# Altium footprint library WR-TBL_Rising Cage Clamp.PcbLib: 435 footprints (part 16 of 28)
Each footprint in its own frame and in the unit in brackets; x right, y up, seen from the top. Pads: shape width x height; smd on the part's side, far side on the other; paste and mask are expansions set on the pad; w line width, h text height; cw(c..) or ccw(c..) is an arc to the next point about the centre after c.
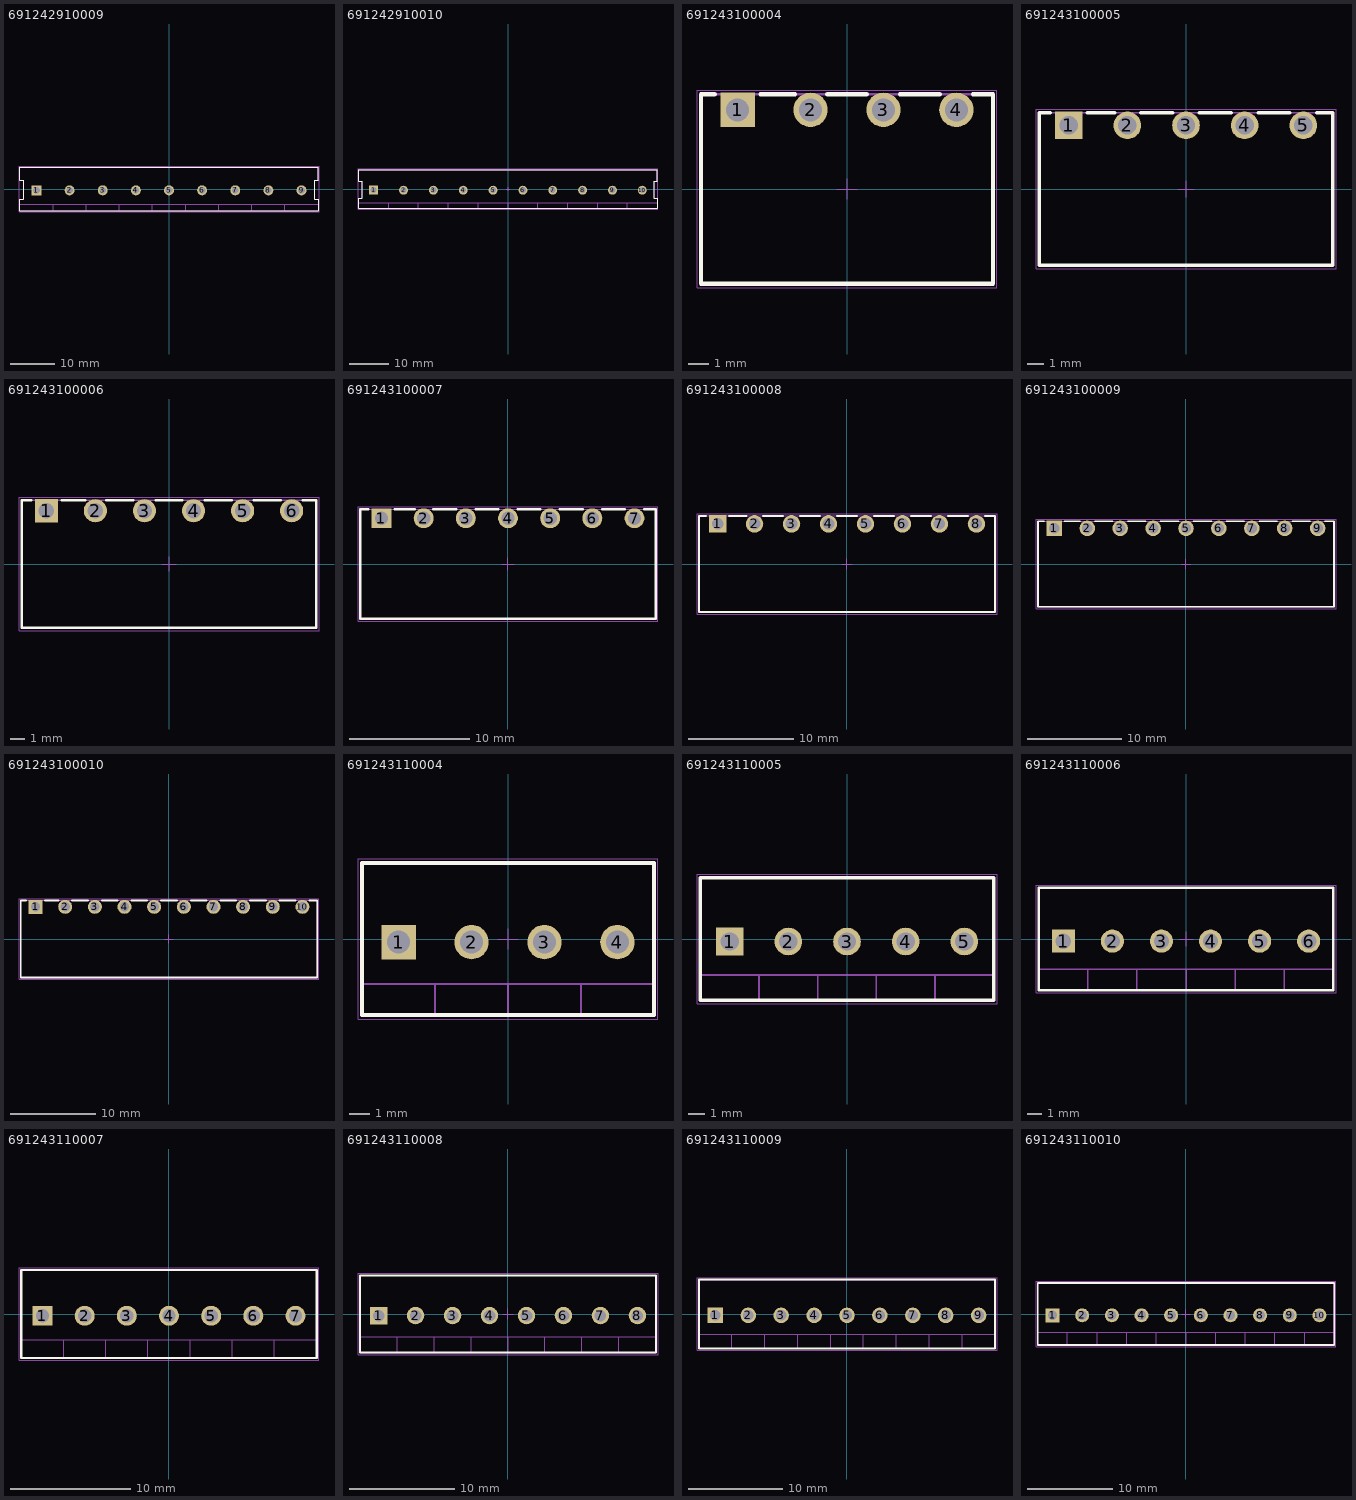
[diagram p15: the footprints below, top view; thin cyan lines are the x and y axes]

## 691242910009 [mm] "Serie 2429 -7.50 mm_9 pins"
height 13.8
pads (9):
  rect 2.25x2.25 hole 1.5: 1(-30,-0.3)
  round 2.25 hole 1.5: 2(-22.5,-0.3) 3(-15,-0.3) 4(-7.5,-0.3) 5(0,-0.3) 6(7.5,-0.3) 7(15,-0.3) 8(22.5,-0.3) 9(30,-0.3)
Top Overlay:
  lines w0.2: -33.75,-4.9 33.75,-4.9 33.75,-2.31 33,-2.31 33,1.94 33.75,1.94 33.75,4.9 -33.75,4.9 -33.75,1.94 -33,1.94 -33,-2.31 -33.75,-2.31 -33.75,-4.9
Mechanical 13:
  lines w0.1: -33.75,-3.4 33.75,-3.4 ; -26.25,-4.9 -26.25,-3.4 ; -18.75,-4.9 -18.75,-3.4 ; -11.25,-4.9 -11.25,-3.4 ; -3.75,-4.9 -3.75,-3.4 ; 3.75,-4.9 3.75,-3.4 ; 11.25,-4.9 11.25,-3.4 ; 18.75,-4.9 18.75,-3.4 ; 26.25,-4.9 26.25,-3.4 ; -33.75,-4.9 -33.75,-2.31 -33,-2.31 -33,1.94 -33.75,1.94 -33.75,4.9 33.75,4.9 33.75,1.94 33,1.94 33,-2.31 33.75,-2.31 33.75,-4.9 -33.75,-4.9
Mechanical 15:
  lines w0.05: -0.5,0 0.5,0 ; 0,-0.5 0,0.5 ; -33.95,-5.1 -33.95,5.1 33.95,5.1 33.95,-5.1 -33.95,-5.1
3D body "691242910009.stp": height 13.9, standoff -3.4, extent -33.75,-4.9 33.75,4.9

## 691242910010 [mm] "Serie 2429 -7.50 mm_10 pins"
height 13.8
pads (10):
  rect 2.25x2.25 hole 1.5: 1(-33.75,-0.3)
  round 2.25 hole 1.5: 2(-26.25,-0.3) 3(-18.75,-0.3) 4(-11.25,-0.3) 5(-3.75,-0.3) 6(3.75,-0.3) 7(11.25,-0.3) 8(18.75,-0.3) 9(26.25,-0.3) 10(33.75,-0.3)
Top Overlay:
  lines w0.2: -37.5,-4.9 37.5,-4.9 37.5,-2.31 36.75,-2.31 36.75,1.94 37.5,1.94 37.5,4.9 -37.5,4.9 -37.5,1.94 -36.75,1.94 -36.75,-2.31 -37.5,-2.31 -37.5,-4.9
Mechanical 13:
  lines w0.1: -37.5,-3.4 37.5,-3.4 ; -30,-4.9 -30,-3.4 ; -22.5,-4.9 -22.5,-3.4 ; -15,-4.9 -15,-3.4 ; -7.5,-4.9 -7.5,-3.4 ; 0,-4.9 0,-3.4 ; 7.5,-4.9 7.5,-3.4 ; 15,-4.9 15,-3.4 ; 22.5,-4.9 22.5,-3.4 ; 30,-4.9 30,-3.4 ; -37.5,-4.9 -37.5,-2.31 -36.75,-2.31 -36.75,1.94 -37.5,1.94 -37.5,4.9 37.5,4.9 37.5,1.94 36.75,1.94 36.75,-2.31 37.5,-2.31 37.5,-4.9 -37.5,-4.9
Mechanical 15:
  lines w0.05: -0.5,0 0.5,0 ; 0,-0.5 0,0.5 ; -37.7,-5.1 -37.7,5.1 37.7,5.1 37.7,-5.1 -37.7,-5.1
3D body "691242910010.stp": height 13.9, standoff -3.4, extent -37.5,-4.9 37.5,4.9

## 691243100004 [mm] "Serie 2431 - 3.50 mm _ 4 pins"
height 7.3
pads (4):
  rect 1.65x1.65 hole 1.1: 1(-5.25,3.8)
  round 1.65 hole 1.1: 2(-1.75,3.8) 3(1.75,3.8) 4(5.25,3.8)
Top Overlay:
  lines w0.2: -6.35,4.55 -7,4.55 -7,-4.55 7,-4.55 7,4.55 6.05,4.55 ; -4.15,4.55 -2.5,4.55 ; -0.95,4.55 0.95,4.55 ; 2.55,4.55 4.45,4.55
Mechanical 13:
  lines w0.1: -7,-4.55 7,-4.55 7,4.55 -7,4.55 -7,-4.55
Mechanical 15:
  lines w0.05: -0.5,0 0.5,0 ; 0,-0.5 0,0.5 ; -7.2,-4.75 7.2,-4.75 7.2,4.75 -7.2,4.75 -7.2,-4.75
3D body "691243100004.stp": height 7.35, standoff -3.45, extent -7,-4.55 7,4.55

## 691243100005 [mm] "Serie 2431 - 3.50 mm _ 5 pins"
height 7.3
pads (5):
  rect 1.65x1.65 hole 1.1: 1(-7,3.8)
  round 1.65 hole 1.1: 2(-3.5,3.8) 3(0,3.8) 4(3.5,3.8) 5(7,3.8)
Top Overlay:
  lines w0.2: -8.1,4.55 -8.75,4.55 -8.75,-4.55 8.75,-4.55 8.75,4.55 7.8,4.55 ; -5.9,4.55 -4.25,4.55 ; -2.7,4.55 -0.8,4.55 ; 0.8,4.55 2.7,4.55 ; 4.3,4.55 6.2,4.55
Mechanical 13:
  lines w0.1: -8.75,-4.55 -8.75,4.55 8.75,4.55 8.75,-4.55 -8.75,-4.55
Mechanical 15:
  lines w0.05: -0.5,0 0.5,0 ; 0,-0.5 0,0.5 ; -8.95,-4.75 -8.95,4.75 8.95,4.75 8.95,-4.75 -8.95,-4.75
3D body "691243100005.stp": height 7.35, standoff -3.45, extent -8.75,-4.55 8.75,4.55

## 691243100006 [mm] "Serie 2431 - 3.50 mm _ 6 pins"
height 7.3
pads (6):
  rect 1.65x1.65 hole 1.1: 1(-8.75,3.8)
  round 1.65 hole 1.1: 2(-5.25,3.8) 3(-1.75,3.8) 4(1.75,3.8) 5(5.25,3.8) 6(8.75,3.8)
Top Overlay:
  lines w0.2: -9.85,4.55 -10.5,4.55 -10.5,-4.55 10.5,-4.55 10.5,4.55 9.55,4.55 ; -7.65,4.55 -6,4.55 ; -4.45,4.55 -2.55,4.55 ; -0.95,4.55 0.95,4.55 ; 2.55,4.55 4.45,4.55 ; 6.05,4.55 7.95,4.55
Mechanical 13:
  lines w0.1: -10.5,-4.55 10.5,-4.55 10.5,4.55 -10.5,4.55 -10.5,-4.55
Mechanical 15:
  lines w0.05: -0.5,0 0.5,0 ; 0,-0.5 0,0.5 ; -10.7,-4.75 10.7,-4.75 10.7,4.75 -10.7,4.75 -10.7,-4.75
3D body "691243100006.stp": height 7.35, standoff -3.45, extent -10.5,-4.55 10.5,4.55

## 691243100007 [mm] "Serie 2431 - 3.50 mm _ 7 pins"
height 7.3
pads (7):
  rect 1.65x1.65 hole 1.1: 1(-10.5,3.8)
  round 1.65 hole 1.1: 2(-7,3.8) 3(-3.5,3.8) 4(0,3.8) 5(3.5,3.8) 6(7,3.8) 7(10.5,3.8)
Top Overlay:
  lines w0.2: -11.6,4.55 -12.25,4.55 -12.25,-4.55 12.25,-4.55 12.25,4.55 11.3,4.55 ; -9.4,4.55 -7.75,4.55 ; -6.2,4.55 -4.3,4.55 ; -2.7,4.55 -0.8,4.55 ; 0.8,4.55 2.7,4.55 ; 4.3,4.55 6.2,4.55 ; 7.8,4.55 9.7,4.55
Mechanical 13:
  lines w0.1: -12.25,-4.55 12.25,-4.55 12.25,4.55 -12.25,4.55 -12.25,-4.55
Mechanical 15:
  lines w0.05: -0.5,0 0.5,0 ; 0,-0.5 0,0.5 ; -12.45,-4.75 12.45,-4.75 12.45,4.75 -12.45,4.75 -12.45,-4.75
3D body "691243100007.stp": height 7.35, standoff -3.45, extent -12.25,-4.55 12.25,4.55

## 691243100008 [mm] "Serie 2431 - 3.50 mm _ 8 pins"
height 7.3
pads (8):
  rect 1.65x1.65 hole 1.1: 1(-12.25,3.8)
  round 1.65 hole 1.1: 2(-8.75,3.8) 3(-5.25,3.8) 4(-1.75,3.8) 5(1.75,3.8) 6(5.25,3.8) 7(8.75,3.8) 8(12.25,3.8)
Top Overlay:
  lines w0.2: -13.35,4.55 -14,4.55 -14,-4.55 14,-4.55 14,4.55 13.05,4.55 ; -11.15,4.55 -9.5,4.55 ; -7.95,4.55 -6.05,4.55 ; -4.45,4.55 -2.55,4.55 ; -0.95,4.55 0.95,4.55 ; 2.55,4.55 4.45,4.55 ; 6.05,4.55 7.95,4.55 ; 9.55,4.55 11.45,4.55
Mechanical 13:
  lines w0.1: -14,-4.55 14,-4.55 14,4.55 -14,4.55 -14,-4.55
Mechanical 15:
  lines w0.05: -0.5,0 0.5,0 ; 0,-0.5 0,0.5 ; -14.2,-4.75 14.2,-4.75 14.2,4.75 -14.2,4.75 -14.2,-4.75
3D body "691243100008.stp": height 7.35, standoff -3.45, extent -14,-4.55 14,4.55

## 691243100009 [mm] "Serie 2431 - 3.50 mm _ 9 pins"
height 7.3
pads (9):
  rect 1.65x1.65 hole 1.1: 1(-14,3.8)
  round 1.65 hole 1.1: 2(-10.5,3.8) 3(-7,3.8) 4(-3.5,3.8) 5(0,3.8) 6(3.5,3.8) 7(7,3.8) 8(10.5,3.8) 9(14,3.8)
Top Overlay:
  lines w0.2: -15.1,4.55 -15.75,4.55 -15.75,-4.55 15.75,-4.55 15.75,4.55 14.8,4.55 ; -12.9,4.55 -11.25,4.55 ; -9.7,4.55 -7.8,4.55 ; -6.2,4.55 -4.3,4.55 ; -2.7,4.55 -0.8,4.55 ; 0.8,4.55 2.7,4.55 ; 4.3,4.55 6.2,4.55 ; 7.8,4.55 9.7,4.55 ; 11.3,4.55 13.2,4.55
Mechanical 13:
  lines w0.1: -15.75,-4.55 15.75,-4.55 15.75,4.55 -15.75,4.55 -15.75,-4.55
Mechanical 15:
  lines w0.05: -0.5,0 0.5,0 ; 0,-0.5 0,0.5 ; -15.95,-4.75 15.95,-4.75 15.95,4.75 -15.95,4.75 -15.95,-4.75
3D body "691243100009.stp": height 7.35, standoff -3.45, extent -15.75,-4.55 15.75,4.55

## 691243100010 [mm] "Serie 2431 - 3.50 mm _ 10 pins"
height 7.3
pads (10):
  rect 1.65x1.65 hole 1.1: 1(-15.75,3.8)
  round 1.65 hole 1.1: 2(-12.25,3.8) 3(-8.75,3.8) 4(-5.25,3.8) 5(-1.75,3.8) 6(1.75,3.8) 7(5.25,3.8) 8(8.75,3.8) 9(12.25,3.8) 10(15.75,3.8)
Top Overlay:
  lines w0.2: -16.85,4.55 -17.5,4.55 -17.5,-4.55 17.5,-4.55 17.5,4.55 16.55,4.55 ; -14.65,4.55 -13,4.55 ; -11.45,4.55 -9.55,4.55 ; -7.95,4.55 -6.05,4.55 ; -4.45,4.55 -2.55,4.55 ; -0.95,4.55 0.95,4.55 ; 2.55,4.55 4.45,4.55 ; 6.05,4.55 7.95,4.55 ; 9.55,4.55 11.45,4.55 ; 13.05,4.55 14.95,4.55
Mechanical 13:
  lines w0.1: -17.5,-4.55 17.5,-4.55 17.5,4.55 -17.5,4.55 -17.5,-4.55
Mechanical 15:
  lines w0.05: -0.5,0 0.5,0 ; 0,-0.5 0,0.5 ; -17.7,-4.75 17.7,-4.75 17.7,4.75 -17.7,4.75 -17.7,-4.75
3D body "691243100010.stp": height 7.35, standoff -3.45, extent -17.5,-4.55 17.5,4.55

## 691243110004 [mm] "Serie 2431 - 3.50 mm_4 pins"
height 9.1
pads (4):
  rect 1.65x1.65 hole 1.1: 1(-5.25,-0.15)
  round 1.65 hole 1.1: 2(-1.75,-0.15) 3(1.75,-0.15) 4(5.25,-0.15)
Top Overlay:
  lines w0.2: -7,-3.65 7,-3.65 7,3.65 -7,3.65 -7,-3.65
Mechanical 13:
  lines w0.1: -7,-2.15 7,-2.15 ; -3.5,-3.65 -3.5,-2.15 ; 0,-3.65 0,-2.15 ; 3.5,-3.65 3.5,-2.15 ; -7,-3.65 -7,3.65 7,3.65 7,-3.65 -7,-3.65
Mechanical 15:
  lines w0.05: -0.5,0 0.5,0 ; 0,-0.5 0,0.5 ; -7.2,-3.85 7.2,-3.85 7.2,3.85 -7.2,3.85 -7.2,-3.85
3D body "691243110004.stp": height 9.15, standoff -3.45, extent -7,-3.65 7,3.65

## 691243110005 [mm] "Serie 2431 - 3.50 mm_5 pins"
height 9.1
pads (5):
  rect 1.65x1.65 hole 1.1: 1(-7,-0.15)
  round 1.65 hole 1.1: 2(-3.5,-0.15) 3(0,-0.15) 4(3.5,-0.15) 5(7,-0.15)
Top Overlay:
  lines w0.2: -8.75,-3.65 -8.75,3.65 8.75,3.65 8.75,-3.65 -8.75,-3.65
Mechanical 13:
  lines w0.1: -8.75,-2.15 8.75,-2.15 ; -5.25,-3.65 -5.25,-2.15 ; -1.75,-3.65 -1.75,-2.15 ; 1.75,-3.65 1.75,-2.15 ; 5.25,-3.65 5.25,-2.15 ; -8.75,-3.65 8.75,-3.65 8.75,3.65 -8.75,3.65 -8.75,-3.65
Mechanical 15:
  lines w0.05: -0.5,0 0.5,0 ; 0,-0.5 0,0.5 ; -8.95,-3.85 -8.95,3.85 8.95,3.85 8.95,-3.85 -8.95,-3.85
3D body "691243110005.stp": height 9.15, standoff -3.45, extent -8.75,-3.65 8.75,3.65

## 691243110006 [mm] "Serie 2431 - 3.50 mm_6 pins"
height 9.1
pads (6):
  rect 1.65x1.65 hole 1.1: 1(-8.75,-0.15)
  round 1.65 hole 1.1: 2(-5.25,-0.15) 3(-1.75,-0.15) 4(1.75,-0.15) 5(5.25,-0.15) 6(8.75,-0.15)
Top Overlay:
  lines w0.2: -10.5,-3.65 -10.5,3.65 10.5,3.65 10.5,-3.65 -10.5,-3.65
Mechanical 13:
  lines w0.1: -10.5,-2.15 10.5,-2.15 ; -7,-3.65 -7,-2.15 ; -3.5,-3.65 -3.5,-2.15 ; 0,-3.65 0,-2.15 ; 3.5,-3.65 3.5,-2.15 ; 7,-3.65 7,-2.15 ; -10.5,-3.65 10.5,-3.65 10.5,3.65 -10.5,3.65 -10.5,-3.65
Mechanical 15:
  lines w0.05: -0.5,0 0.5,0 ; 0,-0.5 0,0.5 ; -10.7,-3.85 -10.7,3.85 10.7,3.85 10.7,-3.85 -10.7,-3.85
3D body "691243110006.stp": height 9.15, standoff -3.45, extent -10.5,-3.65 10.5,3.65

## 691243110007 [mm] "Serie 2431 - 3.50 mm_7 pins"
height 9.1
pads (7):
  rect 1.65x1.65 hole 1.1: 1(-10.5,-0.15)
  round 1.65 hole 1.1: 2(-7,-0.15) 3(-3.5,-0.15) 4(0,-0.15) 5(3.5,-0.15) 6(7,-0.15) 7(10.5,-0.15)
Top Overlay:
  lines w0.2: -12.25,-3.65 -12.25,3.65 12.25,3.65 12.25,-3.65 -12.25,-3.65
Mechanical 13:
  lines w0.1: -12.25,-2.15 12.25,-2.15 ; -8.75,-3.65 -8.75,-2.15 ; -5.25,-3.65 -5.25,-2.15 ; -1.75,-3.65 -1.75,-2.15 ; 1.75,-3.65 1.75,-2.15 ; 5.25,-3.65 5.25,-2.15 ; 8.75,-3.65 8.75,-2.15 ; -12.25,-3.65 12.25,-3.65 12.25,3.65 -12.25,3.65 -12.25,-3.65
Mechanical 15:
  lines w0.05: -0.5,0 0.5,0 ; 0,-0.5 0,0.5 ; -12.45,-3.85 -12.45,3.85 12.45,3.85 12.45,-3.85 -12.45,-3.85
3D body "691243110007.stp": height 9.15, standoff -3.45, extent -12.25,-3.65 12.25,3.65

## 691243110008 [mm] "Serie 2431 - 3.50 mm_8 pins"
height 9.1
pads (8):
  rect 1.65x1.65 hole 1.1: 1(-12.25,-0.15)
  round 1.65 hole 1.1: 2(-8.75,-0.15) 3(-5.25,-0.15) 4(-1.75,-0.15) 5(1.75,-0.15) 6(5.25,-0.15) 7(8.75,-0.15) 8(12.25,-0.15)
Top Overlay:
  lines w0.2: -14,-3.65 -14,3.65 14,3.65 14,-3.65 -14,-3.65
Mechanical 13:
  lines w0.1: -14,-2.15 14,-2.15 ; -10.5,-3.65 -10.5,-2.15 ; -7,-3.65 -7,-2.15 ; -3.5,-3.65 -3.5,-2.15 ; 0,-3.65 0,-2.15 ; 3.5,-3.65 3.5,-2.15 ; 7,-3.65 7,-2.15 ; 10.5,-3.65 10.5,-2.15 ; -14,-3.65 14,-3.65 14,3.65 -14,3.65 -14,-3.65
Mechanical 15:
  lines w0.05: -0.5,0 0.5,0 ; 0,-0.5 0,0.5 ; -14.2,-3.85 -14.2,3.85 14.2,3.85 14.2,-3.85 -14.2,-3.85
3D body "691243110008.stp": height 9.15, standoff -3.45, extent -14,-3.65 14,3.65

## 691243110009 [mm] "Serie 2431 - 3.50 mm_9 pins"
height 9.1
pads (9):
  rect 1.65x1.65 hole 1.1: 1(-14,-0.15)
  round 1.65 hole 1.1: 2(-10.5,-0.15) 3(-7,-0.15) 4(-3.5,-0.15) 5(0,-0.15) 6(3.5,-0.15) 7(7,-0.15) 8(10.5,-0.15) 9(14,-0.15)
Top Overlay:
  lines w0.2: -15.75,-3.65 15.75,-3.65 15.75,3.65 -15.75,3.65 -15.75,-3.65
Mechanical 13:
  lines w0.1: -15.75,-2.15 15.75,-2.15 ; -12.25,-3.65 -12.25,-2.15 ; -8.75,-3.65 -8.75,-2.15 ; -5.25,-3.65 -5.25,-2.15 ; -1.75,-3.65 -1.75,-2.15 ; 1.75,-3.65 1.75,-2.15 ; 5.25,-3.65 5.25,-2.15 ; 8.75,-3.65 8.75,-2.15 ; 12.25,-3.65 12.25,-2.15 ; -15.75,-3.65 -15.75,3.65 15.75,3.65 15.75,-3.65 -15.75,-3.65
Mechanical 15:
  lines w0.05: -0.5,0 0.5,0 ; 0,-0.5 0,0.5 ; -15.95,-3.85 15.95,-3.85 15.95,3.85 -15.95,3.85 -15.95,-3.85
3D body "691243110009.stp": height 9.15, standoff -3.45, extent -15.75,-3.65 15.75,3.65

## 691243110010 [mm] "Serie 2431 - 3.50 mm_10 pins"
height 9.1
pads (10):
  rect 1.65x1.65 hole 1.1: 1(-15.75,-0.15)
  round 1.65 hole 1.1: 2(-12.25,-0.15) 3(-8.75,-0.15) 4(-5.25,-0.15) 5(-1.75,-0.15) 6(1.75,-0.15) 7(5.25,-0.15) 8(8.75,-0.15) 9(12.25,-0.15) 10(15.75,-0.15)
Top Overlay:
  lines w0.2: -17.5,-3.65 17.5,-3.65 17.5,3.65 -17.5,3.65 -17.5,-3.65
Mechanical 13:
  lines w0.1: -17.5,-2.15 17.5,-2.15 ; -14,-3.65 -14,-2.15 ; -10.5,-3.65 -10.5,-2.15 ; -7,-3.65 -7,-2.15 ; -3.5,-3.65 -3.5,-2.15 ; 0,-3.65 0,-2.15 ; 3.5,-3.65 3.5,-2.15 ; 7,-3.65 7,-2.15 ; 10.5,-3.65 10.5,-2.15 ; 14,-3.65 14,-2.15 ; -17.5,-3.65 -17.5,3.65 17.5,3.65 17.5,-3.65 -17.5,-3.65
Mechanical 15:
  lines w0.05: -0.5,0 0.5,0 ; 0,-0.5 0,0.5 ; -17.7,-3.85 17.7,-3.85 17.7,3.85 -17.7,3.85 -17.7,-3.85
3D body "691243110010.stp": height 9.15, standoff -3.45, extent -17.5,-3.65 17.5,3.65